# Altium footprint library Switches.PcbLib: 117 footprints (part 1 of 8)
Each footprint in its own frame and in the unit in brackets; x right, y up, seen from the top. Pads: shape width x height; smd on the part's side, far side on the other; paste and mask are expansions set on the pad; w line width, h text height; cw(c..) or ccw(c..) is an arc to the next point about the centre after c.
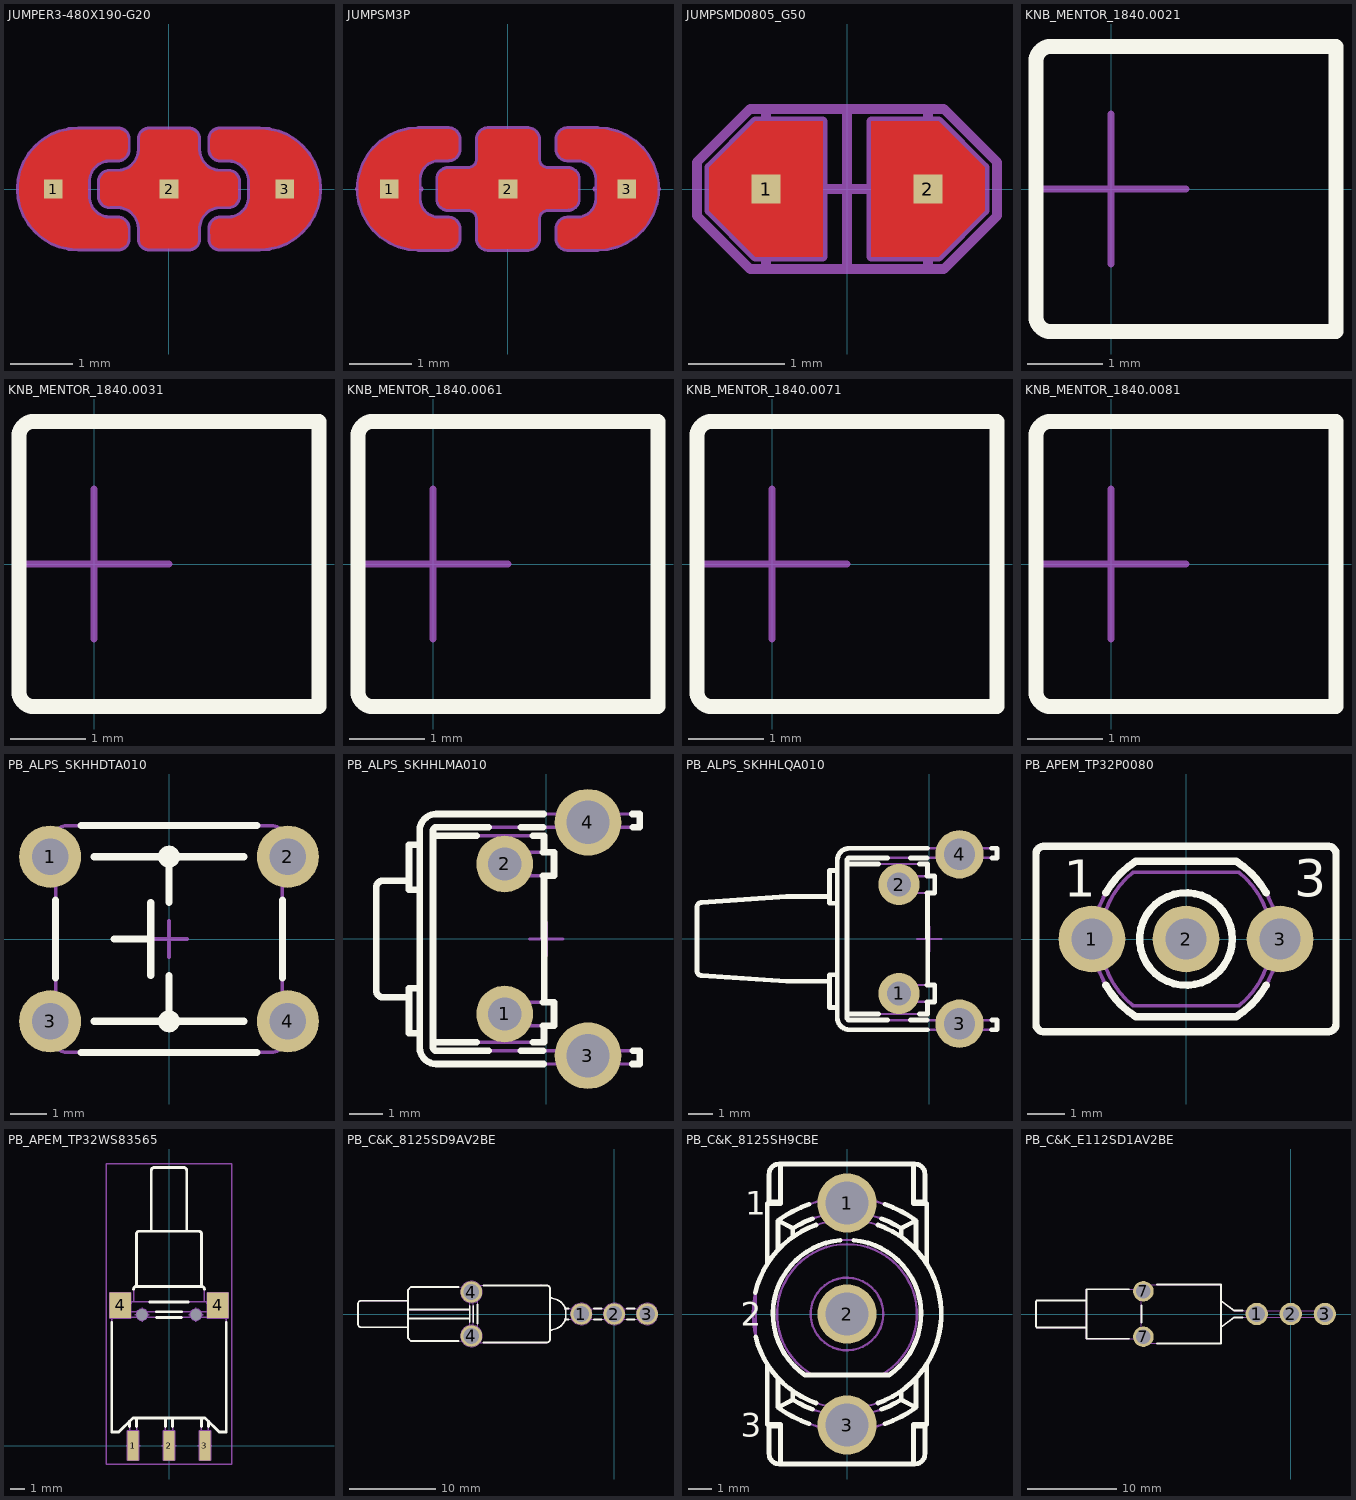
[diagram p0: the footprints below, top view; thin cyan lines are the x and y axes]

## JUMPER3-480X190-G20 [mm] "33 Pads Solder Jumper for Bound by Solder Drop - Overall dimensions 4.8mmx1.9mm, Gap 0.2mm"
pads (3):
  rect 0.3x0.3 smd paste-0.15: 1(-1.85,0) 2(0,0) 3(1.85,0)
Top Layer:
  region: -0.95,-0.273 -0.823,-0.273 -0.753,-0.28 -0.624,-0.333 -0.524,-0.433 -0.471,-0.562 -0.464,-0.632 -0.464,-0.8 -0.464,-0.83 -0.441,-0.885 -0.399,-0.927 -0.344,-0.95 -0.314,-0.95 0.314,-0.95 0.344,-0.95 0.399,-0.927 0.441,-0.885 0.464,-0.83 0.464,-0.8 0.464,-0.632 0.471,-0.562 0.525,-0.433 0.624,-0.333 0.753,-0.28 0.823,-0.273 0.95,-0.273 0.98,-0.273 1.035,-0.25 1.077,-0.208 1.1,-0.153 1.1,-0.123 1.1,0.123 1.1,0.153 1.077,0.208 1.035,0.25 0.98,0.273 0.95,0.273 0.823,0.273 0.753,0.28 0.624,0.333 0.525,0.433 0.471,0.562 0.464,0.632 0.464,0.8 0.464,0.83 0.441,0.885 0.399,0.927 0.344,0.95 0.314,0.95 -0.314,0.95 -0.344,0.95 -0.399,0.927 -0.441,0.885 -0.464,0.83 -0.464,0.8 -0.464,0.632 -0.471,0.562 -0.524,0.433 -0.624,0.333 -0.753,0.28 -0.823,0.273 -0.95,0.273 -0.98,0.273 -1.035,0.25 -1.077,0.208 -1.1,0.153 -1.1,0.123 -1.1,-0.123 -1.1,-0.153 -1.077,-0.208 -1.035,-0.25 -0.98,-0.273
  region: -1.3,-0.123 -1.3,0.123 -1.293,0.191 -1.241,0.317 -1.144,0.414 -1.018,0.466 -0.95,0.473 -0.823,0.473 -0.791,0.473 -0.733,0.497 -0.688,0.542 -0.664,0.6 -0.664,0.632 -0.664,0.8 -0.664,0.83 -0.687,0.885 -0.729,0.927 -0.784,0.95 -0.814,0.95 -1.45,0.95 -1.544,0.95 -1.727,0.913 -1.9,0.842 -2.056,0.738 -2.188,0.606 -2.292,0.45 -2.363,0.277 -2.4,0.094 -2.4,0 -2.4,-0.094 -2.363,-0.277 -2.292,-0.45 -2.188,-0.606 -2.056,-0.738 -1.9,-0.842 -1.727,-0.913 -1.544,-0.95 -1.45,-0.95 -0.814,-0.95 -0.784,-0.95 -0.729,-0.927 -0.687,-0.885 -0.664,-0.83 -0.664,-0.8 -0.664,-0.632 -0.664,-0.6 -0.688,-0.542 -0.733,-0.497 -0.791,-0.473 -0.823,-0.473 -0.95,-0.473 -1.018,-0.466 -1.144,-0.414 -1.241,-0.317 -1.293,-0.191
  region: 0.664,-0.8 0.664,-0.83 0.687,-0.885 0.729,-0.927 0.784,-0.95 0.814,-0.95 1.45,-0.95 1.544,-0.95 1.727,-0.913 1.9,-0.842 2.056,-0.738 2.188,-0.606 2.292,-0.45 2.364,-0.277 2.4,-0.094 2.4,0 2.4,0.094 2.364,0.277 2.292,0.45 2.188,0.606 2.056,0.738 1.9,0.842 1.727,0.913 1.544,0.95 1.45,0.95 0.814,0.95 0.784,0.95 0.729,0.927 0.687,0.885 0.664,0.83 0.664,0.8 0.664,0.632 0.664,0.6 0.688,0.542 0.733,0.497 0.791,0.473 0.823,0.473 0.95,0.473 1.018,0.466 1.144,0.414 1.241,0.317 1.293,0.191 1.3,0.123 1.3,-0.123 1.293,-0.191 1.241,-0.317 1.144,-0.414 1.018,-0.466 0.95,-0.473 0.823,-0.473 0.791,-0.473 0.733,-0.497 0.688,-0.542 0.664,-0.6 0.664,-0.632
Mechanical 8:
  lines w0.1: -2.35,0 -1.85,0 ; -1.85,-0.5 -1.85,0 ; -1.85,0.5 -1.85,0 ; -1.35,0 -1.85,0 ; -0.5,0 0,0 ; 0,-0.5 0,0 ; 0,0.5 0,0 ; 0.5,0 0,0 ; 1.35,0 1.85,0 ; 1.85,-0.5 1.85,0 ; 1.85,0.5 1.85,0 ; 2.35,0 1.85,0 ; -2.4,0 ccw(c-1.45,0) -1.45,-0.95 -0.814,-0.95 ccw(c-0.814,-0.8) -0.664,-0.8 -0.664,-0.632 ccw(c-0.823,-0.632) -0.823,-0.473 -0.95,-0.473 cw(c-0.95,-0.123) -1.3,-0.123 -1.3,0 -1.3,0.123 cw(c-0.95,0.123) -0.95,0.473 -0.823,0.473 ccw(c-0.823,0.632) -0.664,0.632 -0.664,0.8 ccw(c-0.814,0.8) -0.814,0.95 -1.45,0.95 ccw(c-1.45,0) -2.4,0 ; -1.1,-0.123 ccw(c-0.95,-0.123) -0.95,-0.273 -0.823,-0.273 cw(c-0.823,-0.632) -0.464,-0.632 -0.464,-0.8 ccw(c-0.314,-0.8) -0.314,-0.95 0.314,-0.95 ccw(c0.314,-0.8) 0.464,-0.8 0.464,-0.632 cw(c0.823,-0.632) 0.823,-0.273 0.95,-0.273 ccw(c0.95,-0.123) 1.1,-0.123 1.1,0.123 ccw(c0.95,0.123) 0.95,0.273 0.823,0.273 cw(c0.823,0.632) 0.464,0.632 0.464,0.8 ccw(c0.314,0.8) 0.314,0.95 -0.314,0.95 ccw(c-0.314,0.8) -0.464,0.8 -0.464,0.632 cw(c-0.823,0.632) -0.823,0.273 -0.95,0.273 ccw(c-0.95,0.123) -1.1,0.123 -1.1,-0.123 ; 0.664,-0.8 ccw(c0.814,-0.8) 0.814,-0.95 1.45,-0.95 ccw(c1.45,0) 2.4,0 ccw(c1.45,0) 1.45,0.95 0.814,0.95 ccw(c0.814,0.8) 0.664,0.8 0.664,0.632 ccw(c0.823,0.632) 0.823,0.473 0.95,0.473 cw(c0.95,0.123) 1.3,0.123 1.3,0 1.3,-0.123 cw(c0.95,-0.123) 0.95,-0.473 0.823,-0.473 ccw(c0.823,-0.632) 0.664,-0.632 0.664,-0.8

## JUMPSM3P [mm] "2 SMD Pads for Bound by Solder Drop - Equivalent Size 0805 - Gap 0.5mm"
pads (3):
  rect 0.3x0.3 smd paste-0.15: 1(-1.9,0) 2(0,0) 3(1.9,0)
Top Layer:
  region: -1.431,-0.954 -1.557,-0.954 -1.799,-0.889 -2.017,-0.763 -2.194,-0.586 -2.32,-0.368 -2.385,-0.126 -2.385,0.126 -2.32,0.368 -2.194,0.586 -2.017,0.763 -1.799,0.889 -1.557,0.954 -1.431,0.954 -0.954,0.954 -0.922,0.954 -0.864,0.93 -0.819,0.885 -0.795,0.827 -0.795,0.795 -0.795,0.636 -0.795,0.604 -0.819,0.546 -0.864,0.501 -0.922,0.477 -0.954,0.477 -1.113,0.477 -1.175,0.471 -1.29,0.423 -1.377,0.336 -1.425,0.221 -1.431,0.159 -1.431,-0.159 -1.425,-0.221 -1.377,-0.336 -1.29,-0.423 -1.175,-0.471 -1.113,-0.477 -0.954,-0.477 -0.922,-0.477 -0.864,-0.501 -0.819,-0.546 -0.795,-0.604 -0.795,-0.636 -0.795,-0.795 -0.795,-0.827 -0.819,-0.885 -0.864,-0.93 -0.922,-0.954 -0.954,-0.954
  region: 0.795,-0.795 0.795,-0.636 0.795,-0.604 0.819,-0.546 0.864,-0.501 0.922,-0.477 0.954,-0.477 1.113,-0.477 1.175,-0.471 1.29,-0.423 1.377,-0.336 1.425,-0.221 1.431,-0.159 1.431,0.159 1.425,0.221 1.377,0.336 1.29,0.423 1.175,0.471 1.113,0.477 0.954,0.477 0.922,0.477 0.864,0.501 0.819,0.546 0.795,0.604 0.795,0.636 0.795,0.795 0.795,0.827 0.819,0.885 0.864,0.93 0.922,0.954 0.954,0.954 1.431,0.954 1.557,0.954 1.799,0.889 2.017,0.763 2.194,0.586 2.32,0.368 2.385,0.126 2.385,-0.126 2.32,-0.368 2.194,-0.586 2.017,-0.763 1.799,-0.889 1.557,-0.954 1.431,-0.954 0.954,-0.954 0.922,-0.954 0.864,-0.93 0.819,-0.885 0.795,-0.827
  region: -0.477,-0.795 -0.477,-0.477 -0.48,-0.446 -0.504,-0.389 -0.548,-0.345 -0.605,-0.321 -0.636,-0.318 -0.954,-0.318 -0.986,-0.318 -1.044,-0.294 -1.089,-0.249 -1.113,-0.191 -1.113,-0.159 -1.113,0.159 -1.113,0.191 -1.089,0.249 -1.044,0.294 -0.986,0.318 -0.954,0.318 -0.636,0.318 -0.605,0.321 -0.548,0.345 -0.504,0.389 -0.48,0.446 -0.477,0.477 -0.477,0.795 -0.477,0.827 -0.453,0.885 -0.408,0.93 -0.35,0.954 -0.318,0.954 0.318,0.954 0.35,0.954 0.408,0.93 0.453,0.885 0.477,0.827 0.477,0.795 0.477,0.477 0.48,0.446 0.504,0.389 0.548,0.345 0.605,0.321 0.636,0.318 0.954,0.318 0.986,0.318 1.044,0.294 1.089,0.249 1.113,0.191 1.113,0.159 1.113,-0.159 1.113,-0.191 1.089,-0.249 1.044,-0.294 0.986,-0.318 0.954,-0.318 0.636,-0.318 0.605,-0.321 0.548,-0.345 0.504,-0.389 0.48,-0.446 0.477,-0.477 0.477,-0.795 0.477,-0.827 0.453,-0.885 0.408,-0.93 0.35,-0.954 0.318,-0.954 -0.318,-0.954 -0.35,-0.954 -0.408,-0.93 -0.453,-0.885 -0.477,-0.827
Top Solder:
  region: -1.431,-0.954 -1.557,-0.954 -1.799,-0.889 -2.017,-0.763 -2.194,-0.586 -2.32,-0.368 -2.385,-0.126 -2.385,0.126 -2.32,0.368 -2.194,0.586 -2.017,0.763 -1.799,0.889 -1.557,0.954 -1.431,0.954 1.431,0.954 1.557,0.954 1.799,0.889 2.017,0.763 2.194,0.586 2.32,0.368 2.385,0.126 2.385,-0.126 2.32,-0.368 2.194,-0.586 2.017,-0.763 1.799,-0.889 1.557,-0.954 1.431,-0.954
Mechanical 8:
  lines w0.1: -2.4,0 -1.9,0 ; -1.9,-0.5 -1.9,0 ; -1.9,0.5 -1.9,0 ; -1.4,0 -1.9,0 ; -0.5,0 0,0 ; 0,-0.5 0,0 ; 0,0.5 0,0 ; 0.5,0 0,0 ; 1.4,0 1.9,0 ; 1.9,-0.5 1.9,0 ; 1.9,0.5 1.9,0 ; 2.4,0 1.9,0
Mechanical 14:
  lines w0.1: -1.431,-0.954 cw(c-1.431,0) -1.431,0.954 -0.954,0.954 cw(c-0.954,0.795) -0.795,0.795 -0.795,0.636 cw(c-0.954,0.636) -0.954,0.477 -1.113,0.477 ccw(c-1.113,0.159) -1.431,0.159 -1.431,-0.159 ccw(c-1.113,-0.159) -1.113,-0.477 -0.954,-0.477 cw(c-0.954,-0.636) -0.795,-0.636 -0.795,-0.795 cw(c-0.954,-0.795) -0.954,-0.954 -1.431,-0.954 ; -1.113,-0.159 ccw(c-0.954,-0.159) -0.954,-0.318 -0.636,-0.318 cw(c-0.636,-0.477) -0.477,-0.477 -0.477,-0.795 ccw(c-0.318,-0.795) -0.318,-0.954 0.318,-0.954 ccw(c0.318,-0.795) 0.477,-0.795 0.477,-0.477 cw(c0.636,-0.477) 0.636,-0.318 0.954,-0.318 ccw(c0.954,-0.159) 1.113,-0.159 1.113,0.159 ccw(c0.954,0.159) 0.954,0.318 0.636,0.318 cw(c0.636,0.477) 0.477,0.477 0.477,0.795 ccw(c0.318,0.795) 0.318,0.954 0,0.954 -0.318,0.954 ccw(c-0.318,0.795) -0.477,0.795 -0.477,0.477 cw(c-0.636,0.477) -0.636,0.318 -0.954,0.318 ccw(c-0.954,0.159) -1.113,0.159 -1.113,-0.159 ; 0.795,-0.795 ccw(c0.954,-0.795) 0.954,-0.954 1.431,-0.954 ccw(c1.431,0) 1.431,0.954 0.954,0.954 ccw(c0.954,0.795) 0.795,0.795 0.795,0.636 ccw(c0.954,0.636) 0.954,0.477 1.113,0.477 cw(c1.113,0.159) 1.431,0.159 1.431,-0.159 cw(c1.113,-0.159) 1.113,-0.477 0.954,-0.477 ccw(c0.954,-0.636) 0.795,-0.636 0.795,-0.795

## JUMPSMD0805_G50 [mm] "2 SMD Pads for Bound by Solder Drop - Equivalent Size 0805 - Gap 0.5mm"
pads (2):
  rect 0.3x0.3 smd paste-0.15: 1(-0.838,0) 2(0.838,0)
Top Layer:
  region: 0.25,-0.7 0.95,-0.7 1.425,-0.225 1.425,0.225 0.95,0.7 0.25,0.7
  region: -0.25,0.7 -0.95,0.7 -1.425,0.225 -1.425,-0.225 -0.95,-0.7 -0.25,-0.7
Top Solder:
  region: -1.003,0.827 1.003,0.827 1.552,0.278 1.552,-0.278 1.003,-0.827 -1.003,-0.827 -1.552,-0.278 -1.552,0.278
Mechanical 8:
  lines w0.1: -0.838,-0.827 -0.838,0 ; -0.838,0.827 -0.838,0 ; 0,-0.827 0,0 ; 0,0.827 0,0 ; 0.838,-0.827 0.838,0 ; 0.838,0.827 0.838,0 ; -0.838,0 0,0 ; 0,0 0.838,0 ; -1.552,-0.278 -1.552,0.278 -1.003,0.827 1.003,0.827 1.552,0.278 1.552,-0.278 1.003,-0.827 -1.003,-0.827 -1.552,-0.278
Mechanical 14:
  lines w0.1: -1.425,-0.225 -1.425,0.225 -0.95,0.7 -0.25,0.7 -0.25,-0.7 -0.95,-0.7 -1.425,-0.225 ; 0.25,-0.7 0.95,-0.7 1.425,-0.225 1.425,0.225 0.95,0.7 0.25,0.7 0.25,-0.7

## KNB_MENTOR_1840.0021 [mm] "Red Knob For MENTOR Push-Button Switch (Dia. 3.8mm L=4mm)"
height 3.8
Top Overlay:
  lines w0.2: -1,-1.7 ccw(c-0.8,-1.7) -0.8,-1.9 3,-1.9 3,1.9 -0.8,1.9 ccw(c-0.8,1.7) -1,1.7 -1,-1.7
Mechanical 8:
  lines w0.1: -1,0 0,0 ; 0,-1 0,0 ; 0,1 0,0 ; 1,0 0,0
Mechanical 14:
  lines w0.1: -1,-1.7 ccw(c-0.8,-1.7) -0.8,-1.9 3,-1.9 3,1.9 -0.8,1.9 ccw(c-0.8,1.7) -1,1.7 -1,-1.7
3D body "KNB_MENTOR_1840.0021.stp": height 6.95, standoff 3.15, extent -0.993,-1.9 3.007,1.9

## KNB_MENTOR_1840.0031 [mm] "Black Knob For MENTOR Push-Button Switch (Dia. 3.8mm L=4mm)"
height 3.8
Top Overlay:
  lines w0.2: -1,-1.7 ccw(c-0.8,-1.7) -0.8,-1.9 3,-1.9 3,1.9 -0.8,1.9 ccw(c-0.8,1.7) -1,1.7 -1,-1.7
Mechanical 8:
  lines w0.1: -1,0 0,0 ; 0,-1 0,0 ; 0,1 0,0 ; 1,0 0,0
Mechanical 14:
  lines w0.1: -1,-1.7 ccw(c-0.8,-1.7) -0.8,-1.9 3,-1.9 3,1.9 -0.8,1.9 ccw(c-0.8,1.7) -1,1.7 -1,-1.7
3D body "KNB_MENTOR_1840.0031.stp": height 6.95, standoff 3.15, extent -1,-1.9 3,1.9

## KNB_MENTOR_1840.0061 [mm] "Blue Knob For MENTOR Push-Button Switch (Dia. 3.8mm L=4mm)"
height 3.8
Top Overlay:
  lines w0.2: -1,-1.7 ccw(c-0.8,-1.7) -0.8,-1.9 3,-1.9 3,1.9 -0.8,1.9 ccw(c-0.8,1.7) -1,1.7 -1,-1.7
Mechanical 8:
  lines w0.1: -1,0 0,0 ; 0,-1 0,0 ; 0,1 0,0 ; 1,0 0,0
Mechanical 14:
  lines w0.1: -1,-1.7 ccw(c-0.8,-1.7) -0.8,-1.9 3,-1.9 3,1.9 -0.8,1.9 ccw(c-0.8,1.7) -1,1.7 -1,-1.7
3D body "KNB_MENTOR_1840.0061.stp": height 6.95, standoff 3.15, extent -1,-1.9 3,1.9

## KNB_MENTOR_1840.0071 [mm] "Yellow Knob For MENTOR Push-Button Switch (Dia. 3.8mm L=4mm)"
height 3.8
Top Overlay:
  lines w0.2: -1,-1.7 ccw(c-0.8,-1.7) -0.8,-1.9 3,-1.9 3,1.9 -0.8,1.9 ccw(c-0.8,1.7) -1,1.7 -1,-1.7
Mechanical 8:
  lines w0.1: -1,0 0,0 ; 0,-1 0,0 ; 0,1 0,0 ; 1,0 0,0
Mechanical 14:
  lines w0.1: -1,-1.7 ccw(c-0.8,-1.7) -0.8,-1.9 3,-1.9 3,1.9 -0.8,1.9 ccw(c-0.8,1.7) -1,1.7 -1,-1.7
3D body "KNB_MENTOR_1840.0071.stp": height 6.95, standoff 3.15, extent -1,-1.9 3,1.9

## KNB_MENTOR_1840.0081 [mm] "Green Knob For MENTOR Push-Button Switch (Dia. 3.8mm L=4mm)"
height 3.8
Top Overlay:
  lines w0.2: -1,-1.7 ccw(c-0.8,-1.7) -0.8,-1.9 3,-1.9 3,1.9 -0.8,1.9 ccw(c-0.8,1.7) -1,1.7 -1,-1.7
Mechanical 8:
  lines w0.1: -1,0 0,0 ; 0,-1 0,0 ; 0,1 0,0 ; 1,0 0,0
Mechanical 14:
  lines w0.1: -1,-1.7 ccw(c-0.8,-1.7) -0.8,-1.9 3,-1.9 3,1.9 -0.8,1.9 ccw(c-0.8,1.7) -1,1.7 -1,-1.7
3D body "KNB_MENTOR_1840.0081.stp": height 6.95, standoff 3.15, extent -1,-1.9 3,1.9

## PB_ALPS_SKHHDTA010 [mm] "6x6mm Model, 13mm Stem Height Vertical Pushbutton Switch, ALPS SKHH Series"
height 13
pads (4):
  round 1.7 hole 1: 1(-3.25,2.25) 2(3.25,2.25) 3(-3.25,-2.25) 4(3.25,-2.25)
Top Overlay:
  circle w0.2: c0,-2.25 r0.2
  circle w0.2: c0,2.25 r0.2
  lines w0.2: -3.1,-1.059 -3.1,1.059 ; -2.403,-3.1 2.403,-3.1 ; -2.403,3.1 2.403,3.1 ; -2.05,-2.25 2.05,-2.25 ; -2.05,2.25 2.05,2.25 ; -1.5,0 -0.5,0 ; -0.5,-1 -0.5,1 ; 0,-2.25 0,-1 ; 0,1 0,2.25 ; 3.1,-1.059 3.1,1.059
Mechanical 8:
  lines w0.1: -3.75,-2.25 -3.25,-2.25 ; -3.75,2.25 -3.25,2.25 ; -3.25,-2.75 -3.25,-2.25 ; -3.25,-1.75 -3.25,-2.25 ; -3.25,1.75 -3.25,2.25 ; -3.25,2.75 -3.25,2.25 ; -2.75,-2.25 -3.25,-2.25 ; -2.75,2.25 -3.25,2.25 ; -0.5,0 0,0 ; 0,-0.5 0,0 ; 0,0.5 0,0 ; 0.5,0 0,0 ; 2.75,-2.25 3.25,-2.25 ; 2.75,2.25 3.25,2.25 ; 3.25,-2.75 3.25,-2.25 ; 3.25,-1.75 3.25,-2.25 ; 3.25,1.75 3.25,2.25 ; 3.25,2.75 3.25,2.25 ; 3.75,-2.25 3.25,-2.25 ; 3.75,2.25 3.25,2.25
Mechanical 14:
  lines w0.1: -3.1,-2.6 -3.95,-2.6 -3.95,-1.9 -3.1,-1.9 ; -3.1,1.9 -3.95,1.9 -3.95,2.6 -3.096,2.6 ; -2.05,-2.25 2.05,-2.25 ; -2.05,2.25 2.05,2.25 ; -1.5,0 -0.5,0 ; -0.5,-1 -0.5,1 ; 0,-2.25 0,-1 ; 0,1 0,2.25 ; 3.1,-2.6 3.95,-2.6 3.95,-1.9 3.1,-1.9 ; 3.1,1.9 3.95,1.9 3.95,2.6 3.1,2.6 ; -3.1,-2.8 ccw(c-2.8,-2.8) -2.8,-3.1 2.8,-3.1 ccw(c2.8,-2.8) 3.1,-2.8 3.1,2.8 ccw(c2.8,2.8) 2.8,3.1 -2.8,3.1 ccw(c-2.8,2.8) -3.1,2.8 -3.1,-2.8
3D body "PB_ALPS_SKHHDTA010.stp": height 13, standoff -3.5, extent -3.95,-3.1 3.95,3.1

## PB_ALPS_SKHHLMA010 [mm] "Body 6x6mm, Stem height 3.85mm, Horizontal Pushbutton Switch, ALPS Serie SKHH"
height 7.4
pads (4):
  round 1.7 hole 1: 1(-1.25,-2.25) 2(-1.25,2.25)
  round 2 hole 1.3: 3(1.25,-3.5) 4(1.25,3.5)
Top Overlay:
  lines w0.2: -4.12,-1.748 -4.9,-1.75 cw(c-4.9,-1.55) -5.1,-1.55 -5.1,1.55 cw(c-4.9,1.55) -4.9,1.75 -4.12,1.75 ; -3.8,-2.825 -4.12,-2.825 -4.12,-1.475 -3.8,-1.475 ; -3.8,1.475 -4.12,1.475 -4.12,2.825 -3.8,2.825 ; -3.4,-3.1 -2.097,-3.1 ; -3.4,3.1 -2.097,3.1 ; -1.73,-3.35 -3.3,-3.35 cw(c-3.3,-3.25) -3.4,-3.25 -3.4,3.25 cw(c-3.3,3.25) -3.3,3.35 -1.73,3.35 ; -0.77,-3.35 -0.092,-3.35 ; -0.77,3.35 -0.092,3.35 ; -0.403,-3.1 -0.07,-3.1 -0.07,-2.6 ; -0.403,3.1 -0.07,3.1 -0.07,2.6 ; -0.102,-2.6 0.23,-2.6 0.23,-1.9 -0.102,-1.9 ; -0.102,1.9 0.23,1.9 0.23,2.6 -0.102,2.6 ; -0.077,-3.75 -3.3,-3.75 cw(c-3.3,-3.25) -3.8,-3.25 -3.8,3.25 cw(c-3.3,3.25) -3.3,3.75 -0.077,3.75 ; -0.068,1.9 -0.06,-1.9 ; 2.577,-3.75 2.8,-3.75 2.8,-3.35 2.592,-3.35 ; 2.577,3.75 2.8,3.75 2.8,3.35 2.592,3.35
Mechanical 8:
  lines w0.1: -1.75,-2.25 -1.25,-2.25 ; -1.75,2.25 -1.25,2.25 ; -1.25,-2.75 -1.25,-2.25 ; -1.25,-1.75 -1.25,-2.25 ; -1.25,1.75 -1.25,2.25 ; -1.25,2.75 -1.25,2.25 ; -0.75,-2.25 -1.25,-2.25 ; -0.75,2.25 -1.25,2.25 ; -0.5,0 0,0 ; 0,-0.5 0,0 ; 0,0.5 0,0 ; 0.5,0 0,0 ; 0.75,-3.5 1.25,-3.5 ; 0.75,3.5 1.25,3.5 ; 1.25,-4 1.25,-3.5 ; 1.25,-3 1.25,-3.5 ; 1.25,3 1.25,3.5 ; 1.25,4 1.25,3.5 ; 1.75,-3.5 1.25,-3.5 ; 1.75,3.5 1.25,3.5
Mechanical 14:
  lines w0.1: -4.12,-1.748 -4.9,-1.75 cw(c-4.9,-1.55) -5.1,-1.55 -5.1,1.55 cw(c-4.9,1.55) -4.9,1.75 -4.12,1.75 ; -3.8,-2.825 -4.12,-2.825 -4.12,-1.475 -3.8,-1.475 ; -3.8,1.475 -4.12,1.475 -4.12,2.825 -3.8,2.825 ; -3.4,-3.1 -0.07,-3.1 -0.07,-2.6 ; -3.4,3.1 -0.07,3.1 -0.07,2.6 ; -0.068,1.9 -0.06,-1.9 ; -3.8,-3.25 ccw(c-3.3,-3.25) -3.3,-3.75 2.8,-3.75 2.8,-3.35 -3.3,-3.35 cw(c-3.3,-3.25) -3.4,-3.25 -3.4,3.25 cw(c-3.3,3.25) -3.3,3.35 2.8,3.35 2.8,3.75 -3.3,3.75 ccw(c-3.3,3.25) -3.8,3.25 -3.8,-3.25 ; -1.4,-2.6 0.23,-2.6 0.23,-1.9 -1.396,-1.9 -1.4,-2.6 ; -1.4,2.6 -1.396,1.9 0.23,1.9 0.23,2.6 -1.4,2.6
3D body "PB_ALPS_SKHHLMA010.stp": height 7.4, standoff -3.5, extent -5.1,-4.249 2.8,4.249

## PB_ALPS_SKHHLQA010 [mm] "Body 6x6mm, Stem height 8.35mm, Horizontal Pushbutton Switch, ALPS Serie SKHH"
height 7.4
pads (4):
  round 1.7 hole 1: 1(-1.25,-2.25) 2(-1.25,2.25)
  round 2 hole 1.3: 3(1.25,-3.5) 4(1.25,3.5)
Top Overlay:
  lines w0.2: -4.12,-1.748 -5.9,-1.748 -9.413,-1.513 cw(c-9.4,-1.313) -9.6,-1.313 -9.6,1.313 cw(c-9.4,1.313) -9.413,1.513 -5.9,1.75 -4.12,1.75 ; -3.8,-2.825 -4.12,-2.825 -4.12,-1.475 -3.8,-1.475 ; -3.8,1.475 -4.12,1.475 -4.12,2.825 -3.8,2.825 ; -3.4,-3.1 -2.097,-3.1 ; -3.4,3.1 -2.097,3.1 ; -1.73,-3.35 -3.3,-3.35 cw(c-3.3,-3.25) -3.4,-3.25 -3.4,3.25 cw(c-3.3,3.25) -3.3,3.35 -1.73,3.35 ; -0.77,-3.35 -0.092,-3.35 ; -0.77,3.35 -0.092,3.35 ; -0.403,-3.1 -0.07,-3.1 -0.07,-2.6 ; -0.403,3.1 -0.07,3.1 -0.07,2.6 ; -0.102,-2.6 0.23,-2.6 0.23,-1.9 -0.102,-1.9 ; -0.102,1.9 0.23,1.9 0.23,2.6 -0.102,2.6 ; -0.077,-3.75 -3.3,-3.75 cw(c-3.3,-3.25) -3.8,-3.25 -3.8,3.25 cw(c-3.3,3.25) -3.3,3.75 -0.077,3.75 ; -0.068,1.9 -0.06,-1.9 ; 2.577,-3.75 2.8,-3.75 2.8,-3.35 2.592,-3.35 ; 2.577,3.75 2.8,3.75 2.8,3.35 2.592,3.35
Mechanical 8:
  lines w0.1: -1.75,-2.25 -1.25,-2.25 ; -1.75,2.25 -1.25,2.25 ; -1.25,-2.75 -1.25,-2.25 ; -1.25,-1.75 -1.25,-2.25 ; -1.25,1.75 -1.25,2.25 ; -1.25,2.75 -1.25,2.25 ; -0.75,-2.25 -1.25,-2.25 ; -0.75,2.25 -1.25,2.25 ; -0.5,0 0,0 ; 0,-0.5 0,0 ; 0,0.5 0,0 ; 0.5,0 0,0 ; 0.75,-3.5 1.25,-3.5 ; 0.75,3.5 1.25,3.5 ; 1.25,-4 1.25,-3.5 ; 1.25,-3 1.25,-3.5 ; 1.25,3 1.25,3.5 ; 1.25,4 1.25,3.5 ; 1.75,-3.5 1.25,-3.5 ; 1.75,3.5 1.25,3.5
Mechanical 14:
  lines w0.1: -4.12,-1.748 -5.9,-1.748 -9.413,-1.513 cw(c-9.4,-1.313) -9.6,-1.313 -9.6,1.313 cw(c-9.4,1.313) -9.413,1.513 -5.9,1.75 -4.12,1.75 ; -3.8,-2.825 -4.12,-2.825 -4.12,-1.475 -3.8,-1.475 ; -3.8,1.475 -4.12,1.475 -4.12,2.825 -3.8,2.825 ; -3.4,-3.1 -0.07,-3.1 -0.07,-2.6 ; -3.4,3.1 -0.07,3.1 -0.07,2.6 ; -0.068,1.9 -0.06,-1.9 ; -3.8,-3.25 ccw(c-3.3,-3.25) -3.3,-3.75 2.8,-3.75 2.8,-3.35 -3.3,-3.35 cw(c-3.3,-3.25) -3.4,-3.25 -3.4,3.25 cw(c-3.3,3.25) -3.3,3.35 2.8,3.35 2.8,3.75 -3.3,3.75 ccw(c-3.3,3.25) -3.8,3.25 -3.8,-3.25 ; -1.4,-2.6 0.23,-2.6 0.23,-1.9 -1.396,-1.9 -1.4,-2.6 ; -1.4,2.6 -1.396,1.9 0.23,1.9 0.23,2.6 -1.4,2.6
3D body "PB_ALPS_SKHHLQA010.stp": height 7.4, standoff -3.5, extent -9.6,-4.249 2.8,4.249

## PB_APEM_TP32P0080 [mm] "SPDT Momentary Push-Button Switch - Straight PCB - APEM TP Serie"
height 17.75
pads (3):
  round 1.8 hole 1.1: 1(-2.54,0) 2(0,0) 3(2.54,0)
Top Overlay:
  circle w0.2: c0,0 r1.25
  lines w0.2: -2.168,-1.246 ccw(c0,0) -1.356,-2.1 1.356,-2.1 ccw(c0,0) 2.168,-1.246 ; -2.168,1.246 cw(c0,0) -1.356,2.1 1.356,2.1 cw(c0,0) 2.168,1.246 ; -4.05,-2.3 ccw(c-3.85,-2.3) -3.85,-2.5 3.85,-2.5 ccw(c3.85,-2.3) 4.05,-2.3 4.05,2.3 ccw(c3.85,2.3) 3.85,2.5 -3.85,2.5 ccw(c-3.85,2.3) -4.05,2.3 -4.05,-2.3
  text "1" at -3.302,1.143 h1
  text "3" at 2.921,1.143 h1
Mechanical 8:
  lines w0.1: -3.04,0 -2.54,0 ; -2.54,-0.5 -2.54,0 ; -2.54,0.5 -2.54,0 ; -2.04,0 -2.54,0 ; -0.5,0 0,0 ; 0,-0.5 0,0 ; 0,0.5 0,0 ; 0.5,0 0,0 ; 2.04,0 2.54,0 ; 2.54,-0.5 2.54,0 ; 2.54,0.5 2.54,0 ; 3.04,0 2.54,0
Mechanical 14:
  circle w0.1: c0,0 r1.25
  lines w0.1: -4.05,-2.3 ccw(c-3.85,-2.3) -3.85,-2.5 3.85,-2.5 ccw(c3.85,-2.3) 4.05,-2.3 4.05,2.3 ccw(c3.85,2.3) 3.85,2.5 -3.85,2.5 ccw(c-3.85,2.3) -4.05,2.3 -4.05,-2.3 ; -1.432,-1.8 cw(c0,0) -1.432,1.8 1.432,1.8 cw(c0,0) 1.432,-1.8 -1.432,-1.8 ; -1.356,-2.1 cw(c0,0) -1.356,2.1 1.356,2.1 cw(c0,0) 1.356,-2.1 -1.356,-2.1
  text "1" at -3.303,1.144 h1
  text "3" at 2.92,1.144 h1
3D body "PB_APEM_TP32P0080.stp": height 17.75, standoff -3.3, extent -4.05,-2.5 4.05,2.5

## PB_APEM_TP32WS83565 [mm] "Horizontal Surface Mount Tiny Washable Pushbutton Switches With Positioning Pins, APEM TP Series"
height 5.55
pads (7):
  rect 0.8x2.1 smd: 1(-2.54,0) 2(0,0) 3(2.54,0)
  rect 1.5x1.8 smd: 4(-3.45,9.91) 4(3.45,9.91)
  round 0.5 hole 0.8 unplated mask+0.15: MEC(-1.905,9.26) MEC(1.905,9.26)
Top Overlay:
  lines w0.2: -4.05,8.71 -4.05,0.96 -3.55,0.96 -2.55,1.96 2.55,1.96 3.55,0.96 4.05,0.96 4.05,8.71 ; -2.79,1.35 -2.79,1.72 ; -2.5,11.06 cw(c-2.3,11.06) -2.3,11.26 ; -2.29,1.35 -2.29,1.953 ; -1.364,10.16 1.364,10.16 ; -1.25,15.16 -1.25,19.46 cw(c-1.05,19.46) -1.05,19.66 1.05,19.66 cw(c1.05,19.46) 1.25,19.46 1.25,15.16 ; -0.874,9.06 0.874,9.06 ; -0.874,9.46 0.874,9.46 ; -0.25,1.35 -0.25,1.953 ; 0.25,1.35 0.25,1.953 ; 2.29,1.35 2.29,1.953 ; 2.5,11.06 ccw(c2.3,11.06) 2.3,11.26 ; 2.79,1.35 2.79,1.72 ; -2.3,11.26 2.3,11.26 ; -2.3,11.26 -2.3,14.96 cw(c-2.1,14.96) -2.1,15.16 2.1,15.16 cw(c2.1,14.96) 2.3,14.96 2.3,11.26
Mechanical 8:
  circle w0.1: c1.905,9.26 r0.4
  circle w0.1: c-1.905,9.26 r0.4
  lines w0.1: -3.95,9.91 -3.45,9.91 ; -3.45,9.41 -3.45,9.91 ; -3.45,10.41 -3.45,9.91 ; -3.04,0 -2.54,0 ; -2.95,9.91 -3.45,9.91 ; -2.54,-0.5 -2.54,0 ; -2.54,0.5 -2.54,0 ; -2.405,9.26 -1.905,9.26 ; -2.04,0 -2.54,0 ; -1.905,8.76 -1.905,9.26 ; -1.905,9.76 -1.905,9.26 ; -1.405,9.26 -1.905,9.26 ; -0.5,0 0,0 ; 0,-0.5 0,0 ; 0,0.5 0,0 ; 0.5,0 0,0 ; 1.405,9.26 1.905,9.26 ; 1.905,8.76 1.905,9.26 ; 1.905,9.76 1.905,9.26 ; 2.04,0 2.54,0 ; 2.405,9.26 1.905,9.26 ; 2.54,-0.5 2.54,0 ; 2.54,0.5 2.54,0 ; 2.95,9.91 3.45,9.91 ; 3.04,0 2.54,0 ; 3.45,9.41 3.45,9.91 ; 3.45,10.41 3.45,9.91 ; 3.95,9.91 3.45,9.91 ; -4.2,9.01 -4.2,10.81 -2.7,10.81 -2.7,9.01 -4.2,9.01 ; -2.94,-1.05 -2.94,1.05 -2.14,1.05 -2.14,-1.05 -2.94,-1.05 ; -0.4,-1.05 0.4,-1.05 0.4,1.05 -0.4,1.05 -0.4,-1.05 ; 2.14,-1.05 2.94,-1.05 2.94,1.05 2.14,1.05 2.14,-1.05 ; 2.7,9.01 2.7,10.81 4.2,10.81 4.2,9.01 2.7,9.01
Mechanical 14:
  lines w0.1: -4.05,8.859 cw(c-3.85,8.86) -3.85,9.06 ; -4.05,8.86 -4.05,0.96 -3.55,0.96 -2.55,1.96 2.55,1.96 3.55,0.96 4.05,0.96 4.05,8.86 ; -3.95,9.46 3.95,9.46 ; -2.95,9.46 -2.95,10.56 -3.95,10.56 -3.95,9.06 3.95,9.06 3.95,10.56 2.95,10.56 2.95,9.46 ; -2.85,9.46 -2.65,10.16 2.65,10.16 2.85,9.46 ; -2.79,1.72 -2.79,-0.799 -2.29,-0.799 -2.29,1.953 ; -2.5,10.16 -2.5,11.06 cw(c-2.3,11.06) -2.3,11.26 ; -1.25,15.16 -1.25,19.46 cw(c-1.05,19.46) -1.05,19.66 1.05,19.66 cw(c1.05,19.46) 1.25,19.46 1.25,15.16 ; -0.25,1.953 -0.25,-0.799 0.25,-0.799 0.25,1.953 ; 2.29,1.953 2.29,-0.799 2.79,-0.799 2.79,1.72 ; 2.5,10.16 2.5,11.06 ccw(c2.3,11.06) 2.3,11.26 ; 3.85,9.06 cw(c3.85,8.86) 4.05,8.859 ; -2.3,11.26 2.3,11.26 ; -2.3,11.26 -2.3,14.96 cw(c-2.1,14.96) -2.1,15.16 2.1,15.16 cw(c2.1,14.96) 2.3,14.96 2.3,11.26
Mechanical 15:
  lines w0.1: -4.45,-1.3 4.45,-1.3 4.45,19.91 -4.45,19.91 -4.45,-1.3
3D body "PB_APEM_TP32WS83565.stp": height 5.6, standoff -1, extent -4.05,-0.799 4.05,19.66

## PB_C&K_8125SD9AV2BE [mm] "SPDT Snap-acting Momentary Pushbuttom Switch - Vertical Right Angled PCB Mounting, Unthreaded Bushing, C&K 8020 Series"
height 12.7
pads (5):
  round 2.5 hole 1.8: 1(-3.81,0) 2(0,0) 3(3.81,0) 4(-16.51,-2.54) 4(-16.51,2.54)
Top Overlay:
  lines w0.2: -23.825,-1.537 -29.235,-1.537 cw(c-29.235,-1.156) -29.616,-1.156 -29.616,1.156 cw(c-29.235,1.156) -29.235,1.537 -23.825,1.537 ; -23.825,-0.508 -16.713,-0.508 -16.713,0.508 -23.825,0.508 ; -18.002,-3.119 -23.508,-3.124 -23.825,-2.807 -23.825,2.807 -23.508,3.124 -18.002,3.119 ; -16.713,-0.953 -16.713,0.953 ; -16.307,-0.953 -16.307,0.953 ; -15.799,-1.107 -15.799,1.107 ; -15.117,-3.327 -8.56,-3.327 ccw(c-8.561,-2.432) -8.349,-3.302 ; -15.117,3.327 -8.545,3.327 cw(c-8.56,2.438) -8.348,3.302 ; -15.103,-3.302 -7.798,-3.302 ccw(c-7.8,-2.916) -7.417,-2.87 -7.417,2.921 ccw(c-7.798,2.921) -7.798,3.302 -15.103,3.302 ; -7.417,-1.905 -6.754,-1.695 ccw(c-7.29,0) -5.997,-1.22 ccw(c-6.944,-0.282) -5.614,-0.374 -5.614,0.374 ccw(c-6.888,0.308) -5.997,1.22 ccw(c-7.29,0) -6.754,1.695 -7.417,1.905 ; -5.658,-0.635 -5.279,-0.635 ; -5.655,0.635 -5.279,0.635 ; -2.341,-0.635 -1.469,-0.635 ; -2.341,0.635 -1.469,0.635 ; 1.469,-0.635 2.341,-0.635 ; 1.469,0.635 2.341,0.635
Mechanical 8:
  circle w0.1: c-16.51,-2.54 r1.25
  circle w0.1: c-16.51,-2.54 r0.9
  circle w0.1: c-16.51,2.54 r1.25
  circle w0.1: c-16.51,2.54 r0.9
  circle w0.1: c3.81,0 r1.25
  circle w0.1: c0,0 r1.25
  circle w0.1: c-3.81,0 r1.25
  circle w0.1: c3.81,0 r0.9
  circle w0.1: c0,0 r0.9
  circle w0.1: c-3.81,0 r0.9
  lines w0.1: -17.01,-2.54 -16.51,-2.54 ; -17.01,2.54 -16.51,2.54 ; -16.51,-3.04 -16.51,-2.54 ; -16.51,-2.04 -16.51,-2.54 ; -16.51,2.04 -16.51,2.54 ; -16.51,3.04 -16.51,2.54 ; -16.01,-2.54 -16.51,-2.54 ; -16.01,2.54 -16.51,2.54 ; -4.31,0 -3.81,0 ; -3.81,-0.5 -3.81,0 ; -3.81,0.5 -3.81,0 ; -3.31,0 -3.81,0 ; -0.5,0 0,0 ; 0,-0.5 0,0 ; 0,0.5 0,0 ; 0.5,0 0,0 ; 3.31,0 3.81,0 ; 3.81,-0.5 3.81,0 ; 3.81,0.5 3.81,0 ; 4.31,0 3.81,0
Mechanical 14:
  lines w0.1: -23.825,-1.537 -29.235,-1.537 cw(c-29.235,-1.156) -29.616,-1.156 -29.616,1.156 cw(c-29.235,1.156) -29.235,1.537 -23.825,1.537 ; -23.825,-0.508 -16.713,-0.508 -16.713,0.508 -23.825,0.508 ; -16.713,-3.118 -23.508,-3.124 -23.825,-2.807 -23.825,2.807 -23.508,3.124 -16.713,3.118 ; -16.307,-2.819 ccw(c-15.799,-2.819) -15.799,-3.327 -8.56,-3.327 ccw(c-8.561,-2.432) -8.349,-3.302 ; -16.307,2.819 cw(c-15.799,2.819) -15.799,3.327 -8.545,3.327 cw(c-8.56,2.438) -8.348,3.302 ; -7.417,-1.905 -6.754,-1.695 ccw(c-7.29,0) -5.997,-1.22 ccw(c-6.944,-0.282) -5.614,-0.374 -5.614,0.374 ccw(c-6.888,0.308) -5.997,1.22 ccw(c-7.29,0) -6.754,1.695 -7.417,1.905 ; -5.658,-0.635 4.191,-0.635 4.191,0.635 -5.655,0.635 ; -16.713,-3.378 -16.307,-3.378 -16.307,3.378 -16.713,3.378 -16.713,-3.378 ; -15.799,-3.302 -15.799,3.302 -7.798,3.302 cw(c-7.798,2.921) -7.417,2.921 -7.417,-2.87 cw(c-7.8,-2.916) -7.798,-3.302 -15.799,-3.302
3D body "PB_C&K_8125SD9AV2BE.stp": height 12.7, standoff -3.17, extent -29.616,-3.378 4.191,3.378

## PB_C&K_8125SH9CBE [mm] "SPDT Snap-acting Momentary Pusbutton Switch, Contact Rating 0.4VA 20V, 8020 Series"
height 24.1
pads (3):
  round 2.5 hole 1.8: 1(0,4.699) 2(0,0) 3(0,-4.699)
Top Overlay:
  lines w0.2: -3.884,0.903 cw(c0,0) -1.302,3.769 ; -3.869,-0.967 ccw(c0,0) -1.302,-3.769 ; -3.378,-2.119 -3.378,-4.674 -2.82,-4.674 -2.82,-6.35 ; -3.378,2.119 -3.378,4.674 -2.82,4.674 -2.82,6.35 ; -2.922,-2.714 -2.922,-3.953 ; -2.922,2.714 -2.922,3.953 ; -2.82,-4.737 -3.302,-4.737 -3.302,-5.918 ccw(c-2.87,-5.918) -2.87,-6.35 2.87,-6.35 ccw(c2.87,-5.918) 3.302,-5.918 3.302,-4.737 2.819,-4.737 ; -2.82,4.737 -3.302,4.737 -3.302,5.918 cw(c-2.87,5.918) -2.87,6.35 2.87,6.35 cw(c2.87,5.918) 3.302,5.918 3.302,4.737 2.819,4.737 ; -2.299,-3.259 -2.299,-3.625 ; -2.299,3.259 -2.299,3.625 ; -1.599,-4.647 cw(c0,0.003) -2.922,-3.953 ; -1.599,4.647 ccw(c0,-0.003) -2.922,3.953 ; -1.457,-4.038 cw(c0,0) -2.299,-3.625 ; -1.457,4.038 ccw(c0,0) -2.299,3.625 ; -0.283,3.124 ccw(c0,0) -1.787,-2.578 1.787,-2.578 ccw(c0,0) 0.282,3.124 ; 1.302,-3.769 ccw(c0,0) 1.302,3.769 ; 1.457,-4.038 ccw(c0,0) 2.299,-3.625 ; 1.457,4.038 cw(c0,0) 2.299,3.625 ; 1.599,-4.647 ccw(c0,0.003) 2.921,-3.953 ; 1.599,4.647 cw(c0,-0.003) 2.921,3.953 ; 2.299,-3.259 2.299,-3.625 ; 2.299,3.259 2.299,3.625 ; 2.819,-6.35 2.819,-4.674 3.378,-4.674 3.378,-2.119 ; 2.819,6.35 2.819,4.674 3.378,4.674 3.378,2.119 ; 2.921,-2.714 2.921,-3.953 ; 2.921,2.714 2.921,3.953 ; -2.922,-3.953 -2.299,-3.625 ; -2.922,3.953 -2.299,3.625 ; 2.299,-3.625 2.921,-3.953 ; 2.299,3.625 2.921,3.953
  text "3" at -4.5,-5.2 h1
  text "2" at -4.5,-0.5 h1
  text "1" at -4.3,4.2 h1
Mechanical 8:
  lines w0.05: -0.5,-4.699 0,-4.699 ; -0.5,0 0,0 ; -0.5,4.699 0,4.699 ; 0,-5.199 0,-4.699 ; 0,-4.199 0,-4.699 ; 0,-0.5 0,0 ; 0,0.5 0,0 ; 0,4.199 0,4.699 ; 0,5.199 0,4.699 ; 0.5,-4.699 0,-4.699 ; 0.5,0 0,0 ; 0.5,4.699 0,4.699
  text "3" at -4.5,-5.2 h1
  text "2" at -4.5,-0.5 h1
  text "1" at -4.3,4.2 h1
Mechanical 14:
  circle w0.1: c0,0 r1.537
  circle w0.1: c0,0 r1.156
  circle w0.1: c0,0 r3.988
  lines w0.1: -3.861,-0.998 -3.861,0.998 ; -3.378,-2.119 -3.378,-4.674 -2.82,-4.674 -2.82,-6.35 ; -3.378,2.119 -3.378,4.674 -2.82,4.674 -2.82,6.35 ; -2.922,-2.714 -2.922,-3.953 ; -2.922,2.714 -2.922,3.953 ; -2.82,-4.737 -3.302,-4.737 -3.302,-5.918 ccw(c-2.87,-5.918) -2.87,-6.35 2.87,-6.35 ccw(c2.87,-5.918) 3.302,-5.918 3.302,-4.737 2.819,-4.737 ; -2.82,4.737 -3.302,4.737 -3.302,5.918 cw(c-2.87,5.918) -2.87,6.35 2.87,6.35 cw(c2.87,5.918) 3.302,5.918 3.302,4.737 2.819,4.737 ; -2.299,-3.259 -2.299,-3.625 ; -2.299,3.259 -2.299,3.625 ; -1.453,-2.578 cw(c0,0) 1.452,-2.578 ; 2.299,-3.259 2.299,-3.625 ; 2.299,3.259 2.299,3.625 ; 2.819,-6.35 2.819,-4.674 3.378,-4.674 3.378,-2.119 ; 2.819,6.35 2.819,4.674 3.378,4.674 3.378,2.119 ; 2.921,-2.714 2.921,-3.953 ; 2.921,2.714 2.921,3.953 ; -2.922,-3.953 ccw(c0,0.003) 2.921,-3.953 ; -2.922,-3.953 -2.299,-3.625 ; -2.922,3.953 cw(c0,-0.003) 2.921,3.953 ; -2.922,3.953 -2.299,3.625 ; -2.299,-3.625 ccw(c0,0) 2.299,-3.625 ; -2.299,3.625 cw(c0,0) 2.299,3.625 ; 2.299,-3.625 2.921,-3.953 ; 2.299,3.625 2.921,3.953 ; -1.787,-2.578 cw(c0,0) 1.787,-2.578 -1.787,-2.578
3D body "PB_C&K_8125SH9CBE.stp": height 24.08, standoff -4.55, extent -3.988,-6.35 3.988,6.35

## PB_C&K_E112SD1AV2BE [mm] "SPDT Toggle Switch - Vertical Right Angled PCB Mounting, Unthreaded Bushing, C&K E010 Series"
height 12.7
pads (5):
  round 2.5 hole 1.8: 1(-3.81,0) 2(0,0) 3(3.81,0)
  round 2.3 hole 1.6: 7(-16.51,-2.54) 7(-16.51,2.54)
Top Overlay:
  lines w0.2: -22.885,-1.525 -28.425,-1.525 -28.525,-1.425 -28.525,1.425 -28.425,1.525 -22.885,1.525 ; -18.092,-2.78 -22.885,-2.78 ; -18.092,2.78 -22.885,2.78 ; -16.715,-0.953 -16.715,0.953 ; -14.986,-3.3 -7.825,-3.3 -7.825,3.3 -14.986,3.3 ; -7.825,-1.5 -6.332,-0.38 -5.416,-0.38 ; -7.825,1.5 -6.332,0.38 -5.416,0.38 ; -22.885,-2.78 -22.885,2.78 ; -22.885,-2.78 -22.885,2.78
Mechanical 8:
  lines w0.1: -17.51,-2.54 -16.51,-2.54 ; -17.51,2.54 -16.51,2.54 ; -16.51,-3.54 -16.51,-2.54 ; -16.51,-1.54 -16.51,-2.54 ; -16.51,1.54 -16.51,2.54 ; -16.51,3.54 -16.51,2.54 ; -15.51,-2.54 -16.51,-2.54 ; -15.51,2.54 -16.51,2.54 ; -4.81,0 -3.81,0 ; -3.81,-1 -3.81,0 ; -3.81,1 -3.81,0 ; -2.81,0 -3.81,0 ; -1,0 0,0 ; 0,-1 0,0 ; 0,1 0,0 ; 1,0 0,0 ; 2.81,0 3.81,0 ; 3.81,-1 3.81,0 ; 3.81,1 3.81,0 ; 4.81,0 3.81,0
Mechanical 14:
  lines w0.1: -22.885,-1.525 -28.425,-1.525 -28.525,-1.425 -28.525,1.425 -28.425,1.525 -22.885,1.525 ; -16.715,-2.78 -22.885,-2.78 ; -16.715,2.78 -22.885,2.78 ; -7.825,-1.5 -6.332,-0.38 4.445,-0.38 4.445,0.38 -6.332,0.38 -7.825,1.5 ; -22.885,-2.78 -22.885,2.78 ; -22.885,-2.78 -22.885,2.78 ; -16.715,-3.3 -16.715,3.3 -7.825,3.3 -7.825,-3.3 -16.715,-3.3
3D body "PB_C&K_E112SD1AV2BE.stp": height 12.7, standoff -3.18, extent -28.525,-3.3 4.445,3.3